# Altium footprint library Generic Footprint.PcbLib: 160 footprints (part 13 of 20)
Each footprint in its own frame and in the unit in brackets; x right, y up, seen from the top. Pads: shape width x height; smd on the part's side, far side on the other; paste and mask are expansions set on the pad; w line width, h text height; cw(c..) or ccw(c..) is an arc to the next point about the centre after c.
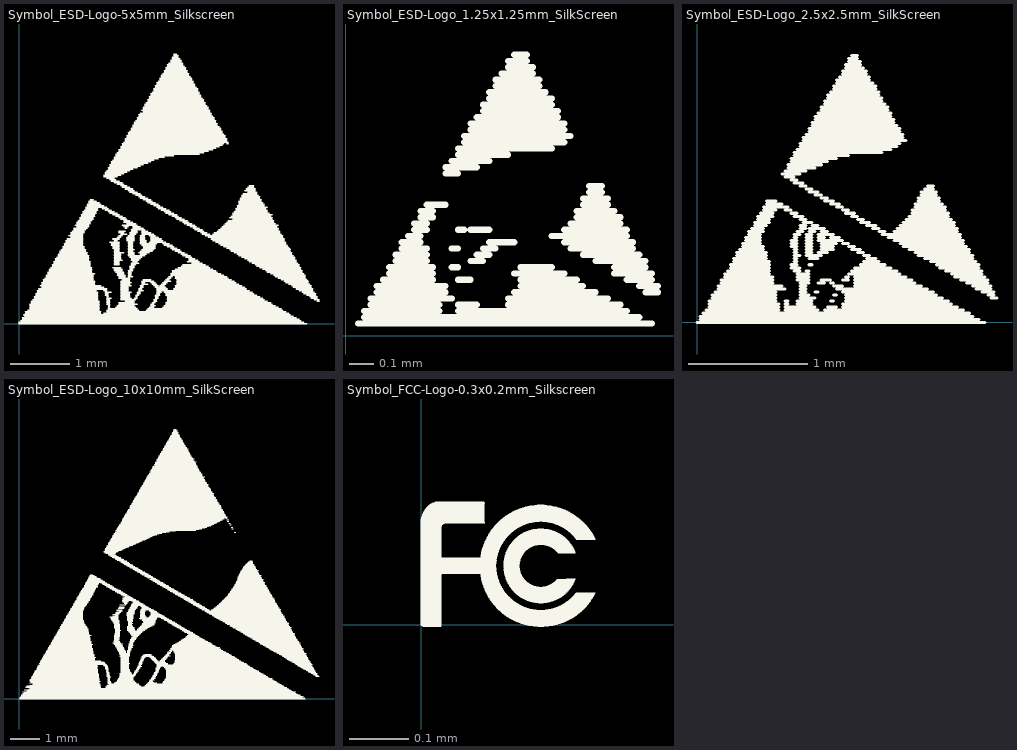
[diagram p12: the footprints below, top view; thin cyan lines are the x and y axes]

## Symbol_ESD-Logo-5x5mm_Silkscreen [mm]
Top Overlay:
  drawing of 500 lines, arcs and shapes, not listed

## Symbol_ESD-Logo_1.25x1.25mm_SilkScreen [mm]
Top Overlay:
  lines w0.025: 0.051,0.051 1.245,0.051 ; 0.076,0.076 1.194,0.076 ; 0.076,0.102 0.381,0.102 ; 0.102,0.127 0.381,0.127 ; 0.102,0.152 0.432,0.152 ; 0.127,0.178 0.406,0.178 ; 0.127,0.203 0.406,0.203 ; 0.152,0.229 0.356,0.229 ; 0.178,0.254 0.356,0.254 ; 0.178,0.279 0.356,0.279 ; 0.203,0.305 0.33,0.305 ; 0.203,0.33 0.33,0.33 ; 0.229,0.356 0.33,0.356 ; 0.229,0.381 0.305,0.381 ; 0.254,0.406 0.305,0.406 ; 0.279,0.432 0.33,0.432 ; 0.279,0.457 0.33,0.457 ; 0.305,0.483 0.356,0.483 ; 0.305,0.508 0.356,0.508 ; 0.33,0.533 0.406,0.533 ; 0.406,0.66 0.457,0.66 ; 0.406,0.686 0.533,0.686 ; 0.432,0.279 0.457,0.279 ; 0.432,0.356 0.457,0.356 ; 0.432,0.711 0.584,0.711 ; 0.457,0.102 1.143,0.102 ; 0.457,0.127 0.533,0.127 ; 0.457,0.229 0.508,0.229 ; 0.457,0.432 0.483,0.432 ; 0.457,0.737 0.66,0.737 ; 0.457,0.762 0.838,0.762 ; 0.483,0.787 0.889,0.787 ; 0.483,0.813 0.914,0.813 ; 0.508,0.305 0.559,0.305 ; 0.508,0.432 0.584,0.432 ; 0.508,0.838 0.889,0.838 ; 0.508,0.864 0.889,0.864 ; 0.533,0.33 0.584,0.33 ; 0.533,0.889 0.864,0.889 ; 0.559,0.356 0.61,0.356 ; 0.559,0.914 0.864,0.914 ; 0.559,0.94 0.838,0.94 ; 0.584,0.381 0.686,0.381 ; 0.584,0.965 0.838,0.965 ; 0.584,0.991 0.813,0.991 ; 0.61,1.016 0.787,1.016 ; 0.61,1.041 0.787,1.041 ; 0.635,1.067 0.762,1.067 ; 0.66,0.127 1.118,0.127 ; 0.66,0.152 1.067,0.152 ; 0.66,1.092 0.762,1.092 ; 0.66,1.118 0.737,1.118 ; 0.686,0.178 1.016,0.178 ; 0.686,0.254 0.889,0.254 ; 0.686,1.143 0.737,1.143 ; 0.711,0.203 0.965,0.203 ; 0.711,0.229 0.94,0.229 ; 0.711,0.279 0.838,0.279 ; 0.838,0.406 1.143,0.406 ; 0.889,0.381 1.168,0.381 ; 0.889,0.432 1.143,0.432 ; 0.914,0.356 1.168,0.356 ; 0.914,0.457 1.118,0.457 ; 0.94,0.483 1.118,0.483 ; 0.94,0.508 1.092,0.508 ; 0.965,0.33 1.194,0.33 ; 0.965,0.533 1.067,0.533 ; 0.965,0.559 1.067,0.559 ; 0.991,0.584 1.041,0.584 ; 0.991,0.61 1.041,0.61 ; 1.016,0.305 1.219,0.305 ; 1.092,0.254 1.245,0.254 ; 1.092,0.279 1.219,0.279 ; 1.143,0.229 1.245,0.229 ; 1.194,0.203 1.27,0.203 ; 1.219,0.178 1.27,0.178

## Symbol_ESD-Logo_2.5x2.5mm_SilkScreen [mm]
Top Overlay:
  drawing of 230 lines, arcs and shapes, not listed

## Symbol_ESD-Logo_10x10mm_SilkScreen [mm]
Top Overlay:
  drawing of 1011 lines, arcs and shapes, not listed

## Symbol_FCC-Logo-0.3x0.2mm_Silkscreen [mm]
Top Overlay:
  drawing of 4310 lines, arcs and shapes, not listed